# Altium footprint library THU.PcbLib: 477 footprints (part 25 of 30)
Each footprint in its own frame and in the unit in brackets; x right, y up, seen from the top. Pads: shape width x height; smd on the part's side, far side on the other; paste and mask are expansions set on the pad; w line width, h text height; cw(c..) or ccw(c..) is an arc to the next point about the centre after c.
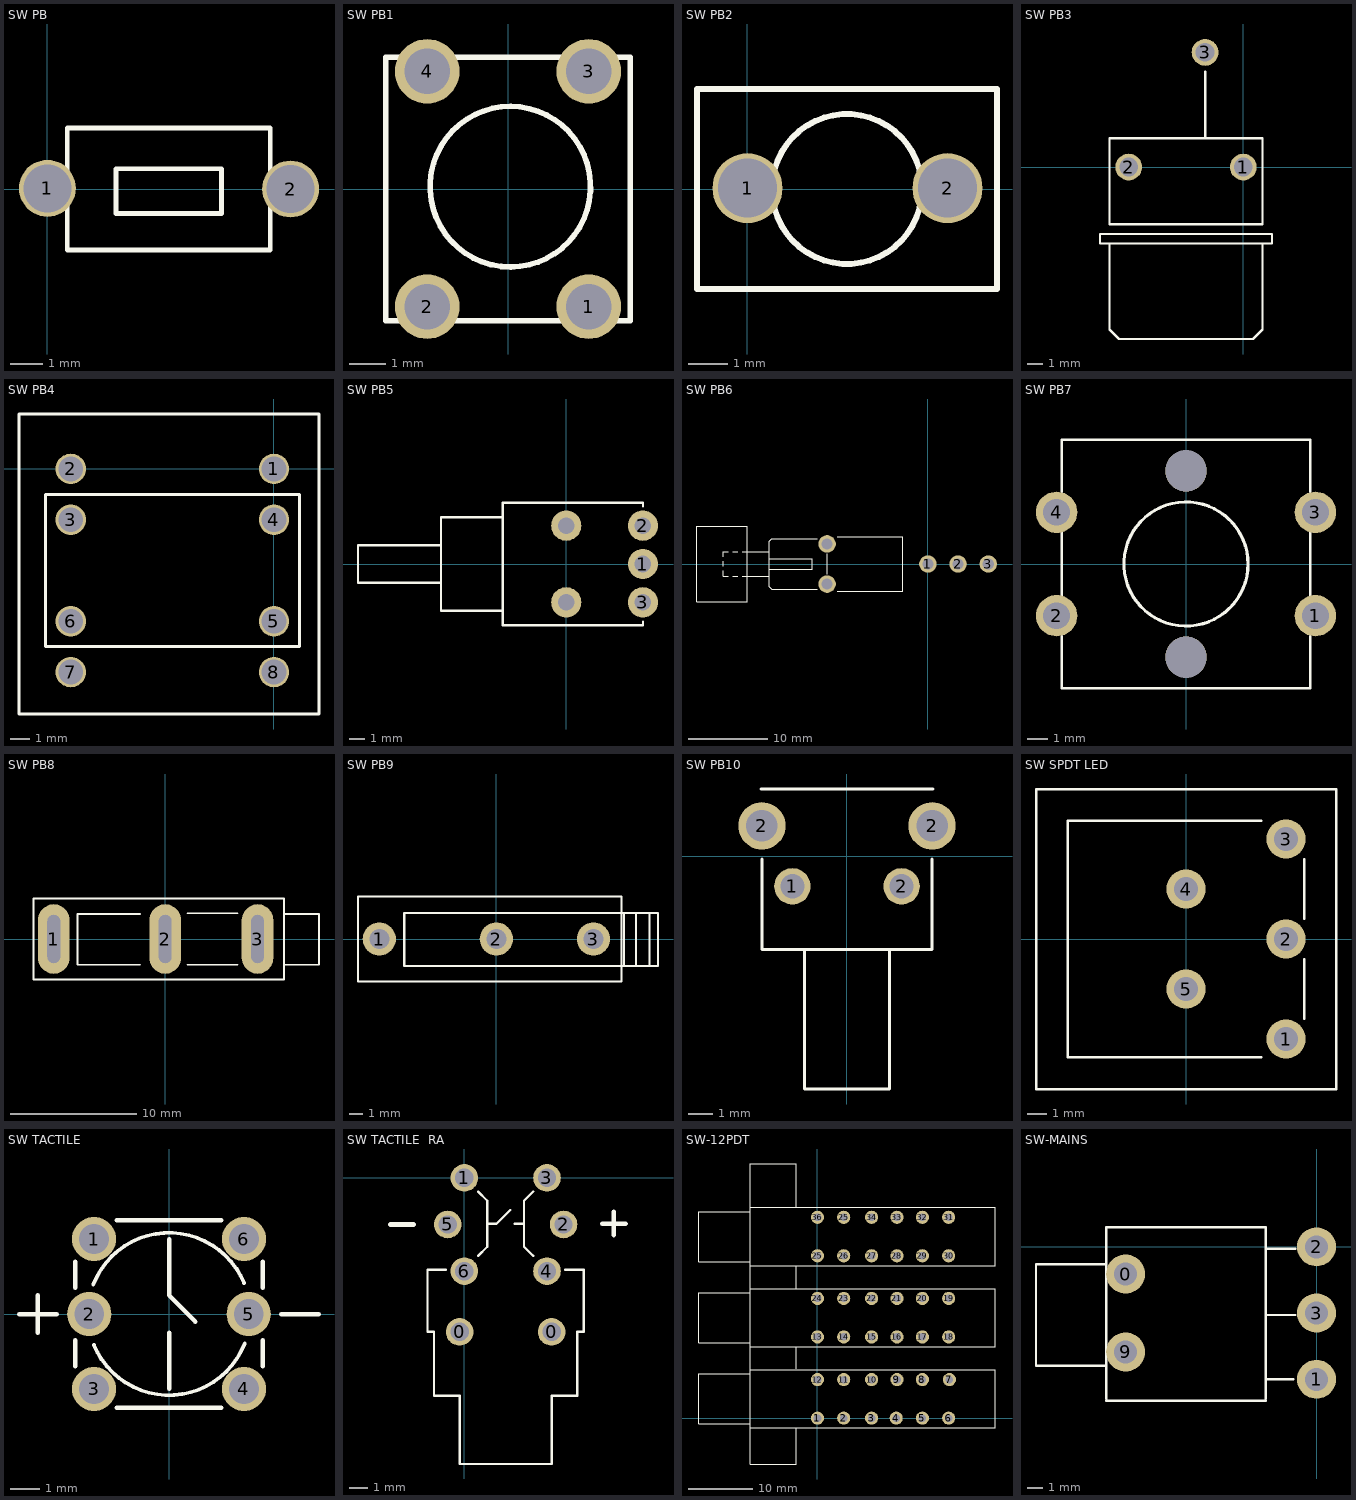
[diagram p24: the footprints below, top view; thin cyan lines are the x and y axes]

## SW PB [mil]
pads (2):
  round 70 hole 59: 1(0.5,0.81) 2(300,0)
TopOverlay:
  lines w6: 25,-75 275,-75 275,75 25,75 25,-75 ; 85,-30 215,-30 215,25 85,25 85,-30

## SW PB1 [mil]
pads (4):
  round 70 hole 49: 1(87.5,-127.5) 2(-87.5,-127.5) 3(87.5,127.5) 4(-87.5,127.5)
TopOverlay:
  lines w6: -18.55,-81.92 cw(c2.5,2.5) -17.07,-82.27 ; -132.5,-142.5 -132.5,142.5 -102.5,142.5 102.5,142.5 132.5,142.5 132.5,-142.5 102.5,-142.5 -102.5,-142.5 -132.5,-142.5

## SW PB2 [mil]
pads (2):
  round 70 hole 59: 1(0.5,0.81) 2(200.5,0.81)
TopOverlay:
  circle w6: c100,0 r75
  lines w6: -50,-100 250,-100 250,100 -50,100 -50,-100

## SW PB3 [mil]
pads (3):
  round 70 hole 49: 1(0,0) 2(-300,0) 3(-100,300)
TopOverlay:
  lines w6: -350,-200 -350,-425 -325,-450 25,-450 50,-425 50,-200 ; -100,75 -100,250 ; -375,-200 -375,-175 75,-175 75,-200 -375,-200 ; -350,-150 50,-150 50,75 -350,75 -350,-150

## SW PB4 [mil]
pads (8):
  round 60 hole 49: 1(0,0) 2(-400,0) 3(-400,-100) 4(0,-100) 5(0,-300) 6(-400,-300) 7(-400,-400) 8(0,-400)
TopOverlay:
  lines w6: -501.97,-482.48 88.58,-482.48 88.58,108.07 -501.97,108.07 -501.97,-482.48 ; -450,-350 -450,-50 50,-50 50,-350 -450,-350

## SW PB5 [mm] "SPDT Horizontal PCB mount"
height 6.2
pads (5):
  round 2 hole 1.1 unplated: 1(5.08,0) 2(5.08,2.54) 3(5.08,-2.54) ""(0,-2.54) ""(0,2.54)
TopOverlay:
  lines w0.152: -8.3,-1.25 -13.8,-1.25 -13.8,0 -13.8,1.25 -8.3,1.25 ; -4.201,-3.1 -8.3,-3.1 -8.3,0 -8.3,3.1 -4.201,3.1 ; 5.08,-3.81 5.08,-4.065 0,-4.065 -4.2,-4.065 -4.2,4.065 0,4.065 5.08,4.065 5.08,3.81

## SW PB6 [mm] "C & K  8121SD9AV2GE"
height 12.7
pads (5):
  round 2.2 hole 1.4: 1(0,0) 2(3.81,0) 3(7.62,0) ""(-12.7,-2.54) ""(-12.7,2.54)
TopOverlay:
  lines w0.127: -25.81,-1.55 -25.175,-1.55 ; -25.81,-1.515 -25.81,-0.88 ; -25.81,-0.3 -25.81,0.335 ; -25.81,0.915 -25.81,1.55 -25.175,1.55 ; -24.595,-1.55 -23.96,-1.55 ; -24.595,1.55 -23.96,1.55 ; -23.38,-1.55 -22.745,-1.55 ; -23.38,1.55 -22.745,1.55 -20.021,1.55 ; -22.76,-1.549 -20.02,-1.549 ; -20.02,-0.635 -14.605,-0.635 -14.605,0.635 -20.02,0.635 ; -13.97,-3.175 -19.685,-3.175 -20.02,-2.84 -20.02,0 -20.02,2.84 -19.685,3.175 -13.97,3.175 ; -12.7,-1.27 -12.7,1.27 ; -11.43,-3.43 -3.175,-3.43 -3.175,0 -3.175,3.43 -11.43,3.43 ; -29.11,-4.765 -22.76,-4.765 -22.76,0 -22.76,4.765 -29.11,4.765 -29.11,-4.765

## SW PB7 [mm] "OMRON B3W-4000 TACTILE SWITCH"
height 4.3
pads (6):
  round 2 hole 1.3: 1(6.25,-2.5) 2(-6.25,-2.5) 3(6.25,2.5) 4(-6.25,2.5)
  round 2 hole 2 unplated: ""(0,-4.5) ""(0,4.5)
TopOverlay:
  circle w0.152: c0,0 r3
  lines w0.127: -6,-3.5 -6,-6 0,-6 6,-6 6,-3.5 ; -6,-1.5 -6,0 -6,1.5 ; -6,3.5 -6,6 0,6 6,6 6,3.5 ; 6,-1.5 6,0 6,1.5

## SW PB8 [mm] "OMRON SS-01GL-E"
height 11.2
pads (3):
  oval 2.5x5.5 hole 1 slot 3.8 at 90 deg: 1(-8.8,0) 2(0,0) 3(7.3,0)
TopOverlay:
  lines w0.152: -1.968,-2.032 -6.922,-2.032 -6.922,1.968 -1.968,1.968 ; 1.778,-2.032 5.715,-2.032 ; 1.778,2.032 5.715,2.032 ; 9.4,-2.032 12.155,-2.032 12.155,1.968 9.4,1.968 ; -10.4,-3.2 9.4,-3.2 9.4,3.2 -10.4,3.2 -10.4,0 -10.4,-3.2

## SW PB9 [mm] "SS-01GL13D"
height 10.2
pads (3):
  round 2.5 hole 1.5: 1(-8.8,0) 2(0,0) 3(7.3,0)
TopOverlay:
  lines w0.152: 9.615,-2.032 9.615,1.968 ; 10.504,-2.032 10.504,1.968 ; 11.52,-2.032 11.52,1.968 ; -10.4,-3.2 9.4,-3.2 9.4,3.2 -10.4,3.2 -10.4,0 -10.4,-3.2 ; -6.922,-2.032 -6.922,1.968 12.155,1.968 12.155,-2.032 -6.922,-2.032

## SW PB10 [mm] "FSMRA4JH04"
height 7.01
pads (4):
  round 1.5 hole 1: 1(-2.25,-1.245) 2(2.25,-1.245)
  round 1.95 hole 1.3: 2(-3.505,1.245) 2(3.505,1.245)
TopOverlay:
  lines w0.127: -3.547,2.765 0,2.765 3.547,2.765 ; -3.505,-0.127 -3.505,-3.855 0.042,-3.855 ; -1.755,-3.855 -1.755,-9.595 0,-9.595 1.755,-9.595 1.755,-3.855 ; -0.042,-3.855 3.505,-3.855 3.505,-0.127
3D body "c-1-1825027-1-g-3d.stp": height 7.04, standoff -3.48, extent -4.178,-9.601 4.229,2.756

## SW SPDT LED [mm] "NKK UB15SKW035C-1JC"
height 10
pads (5):
  round 2 hole 1.2: 1(5.08,-5.08) 2(5.08,0) 3(5.08,5.08) 4(0,2.54) 5(0,-2.54)
TopOverlay:
  lines w0.127: 3.81,-6 -6,-6 -6,6 3.81,6 ; 6,-4.04 6,-2.54 6,-1.04 ; 6,1.04 6,2.54 6,4.04 ; -7.62,-7.62 -7.62,7.62 7.62,7.62 7.62,-7.62 -7.62,-7.62

## SW TACTILE [mm] "S1174 • SPST Red LED Metallic Round Tactile Switch"
height 17.8
pads (6):
  round 1.5 hole 1: 1(-2.54,2.54) 2(-2.7,0) 3(-2.54,-2.54) 4(2.54,-2.54) 5(2.7,0) 6(2.54,2.54)
TopOverlay:
  lines w0.127: -2.563,0.997 cw(c0,0) 2.543,1.047 ; -2.543,-1.047 ccw(c0,0) 2.563,-0.997
  lines w0.152: -5.08,0 -3.81,0 ; -4.445,-0.635 -4.445,0.635 ; -3.175,-1.778 -3.175,-0.889 ; -3.175,0.889 -3.175,1.778 ; -1.778,-3.175 1.778,-3.175 ; -1.778,3.175 1.778,3.175 ; 0,-2.54 0,-0.635 ; 0,2.54 0,0.635 0.889,-0.254 ; 3.175,-1.778 3.175,-0.889 ; 3.175,0.889 3.175,1.778 ; 3.81,0 5.08,0
3D body: height 18.5, standoff 10.5, extent -2.75,-2.75 2.75,2.75
3D body: height 10.5, standoff 8, extent -4,-4 4,4
3D body: height 8, standoff 0, extent -3,-3 3,3

## SW TACTILE  RA [mm] "SPST LED 90 DEG Mount Metallic Round Tactile Switch"
height 6.3
pads (8):
  round 1.5 hole 1: 0(-0.254,-8.38) 0(4.754,-8.38) 1(0,0) 2(5.4,-2.54) 3(4.5,0) 4(4.5,-5.08) 5(-0.9,-2.54) 6(0,-5.08)
TopOverlay:
  lines w0.127: -1,-5 -2,-5 -2,-8.38 -1.651,-8.38 -1.651,-11.862 -0.254,-11.862 -0.254,-15.57 4.754,-15.57 4.754,-11.862 6.151,-11.862 6.151,-8.38 6.5,-8.38 6.5,-5 5.5,-5 ; 0.75,-4.25 1.25,-3.75 1.25,-1.25 0.75,-0.75 ; 1.25,-2.5 1.75,-2.5 2.5,-1.75 ; 2.75,-2.5 3.25,-2.5 ; 3.75,-4.25 3.25,-3.75 3.25,-1.25 3.75,-0.75
  lines w0.254: -4.013,-2.54 -2.743,-2.54 ; 7.5,-2.5 8.77,-2.5 ; 8.137,-3.111 8.137,-1.841
3D body "Switch.STEP": height 7.27, standoff -3.27, extent -2.007,-15.591 6.493,0.909

## SW-12PDT [mil]
pads (36):
  round 80 hole 46: 1(0,0) 2(160,0) 3(330,0) 4(480,0) 5(640,0) 6(800,0) 7(805,235) 8(640,235) 9(485,235) 10(330,235) 11(160,235) 12(0,235) 13(0,495) 14(160,495) 15(330,495) 16(485,495) 17(640,495) 18(800,495) 19(800,730) 20(640,730) 21(485,730) 22(330,730) 23(160,730) 24(0,730) 25(0,990) 25(160,1225) 26(160,990) 27(330,990) 28(485,990) 29(640,990) 30(800,990) 31(800,1225) 32(640,1225) 33(485,1225) 34(330,1225) 36(0,1225)
TopOverlay:
  lines w6: -410,-35 -725,-35 -725,270 -410,270 ; -410,445 -410,295 ; -410,460 -725,460 -725,765 -410,765 ; -410,955 -725,955 -725,1260 -410,1260 ; -410,1290 -410,1550 -130,1550 -130,1285 ; -130,-65 -130,-280 -410,-280 -410,-60 ; -130,300 -130,430 ; -130,790 -130,930 ; -410,-60 -170,-60 1085,-60 1085,295 -170,295 -410,295 ; -410,-60 -410,295 ; -410,790 -170,790 1085,790 1085,435 -170,435 -410,435 -410,790 ; -410,790 -410,930 ; -410,930 -170,930 1085,930 1085,1285 -170,1285 -410,1285 -410,930

## SW-MAINS [mil]
pads (5):
  round 100 hole 59: 0(-490,-70) 1(0,-340) 2(0,0) 3(0,-170) 9(-490,-270)
TopOverlay:
  lines w6: -545,-45 -720,-45 -720,-305 -540,-305 ; -540,-395 -130,-395 ; -540,-390 -540,50 -130,50 -130,-175 ; -130,-390 -130,-175 ; -130,-340 -60,-340 ; -130,-5 -55,-5 ; -55,-175 -130,-175